# Altium footprint library OltestLib.PcbLib: 139 footprints (part 5 of 9)
Each footprint in its own frame and in the unit in brackets; x right, y up, seen from the top. Pads: shape width x height; smd on the part's side, far side on the other; paste and mask are expansions set on the pad; w line width, h text height; cw(c..) or ccw(c..) is an arc to the next point about the centre after c.
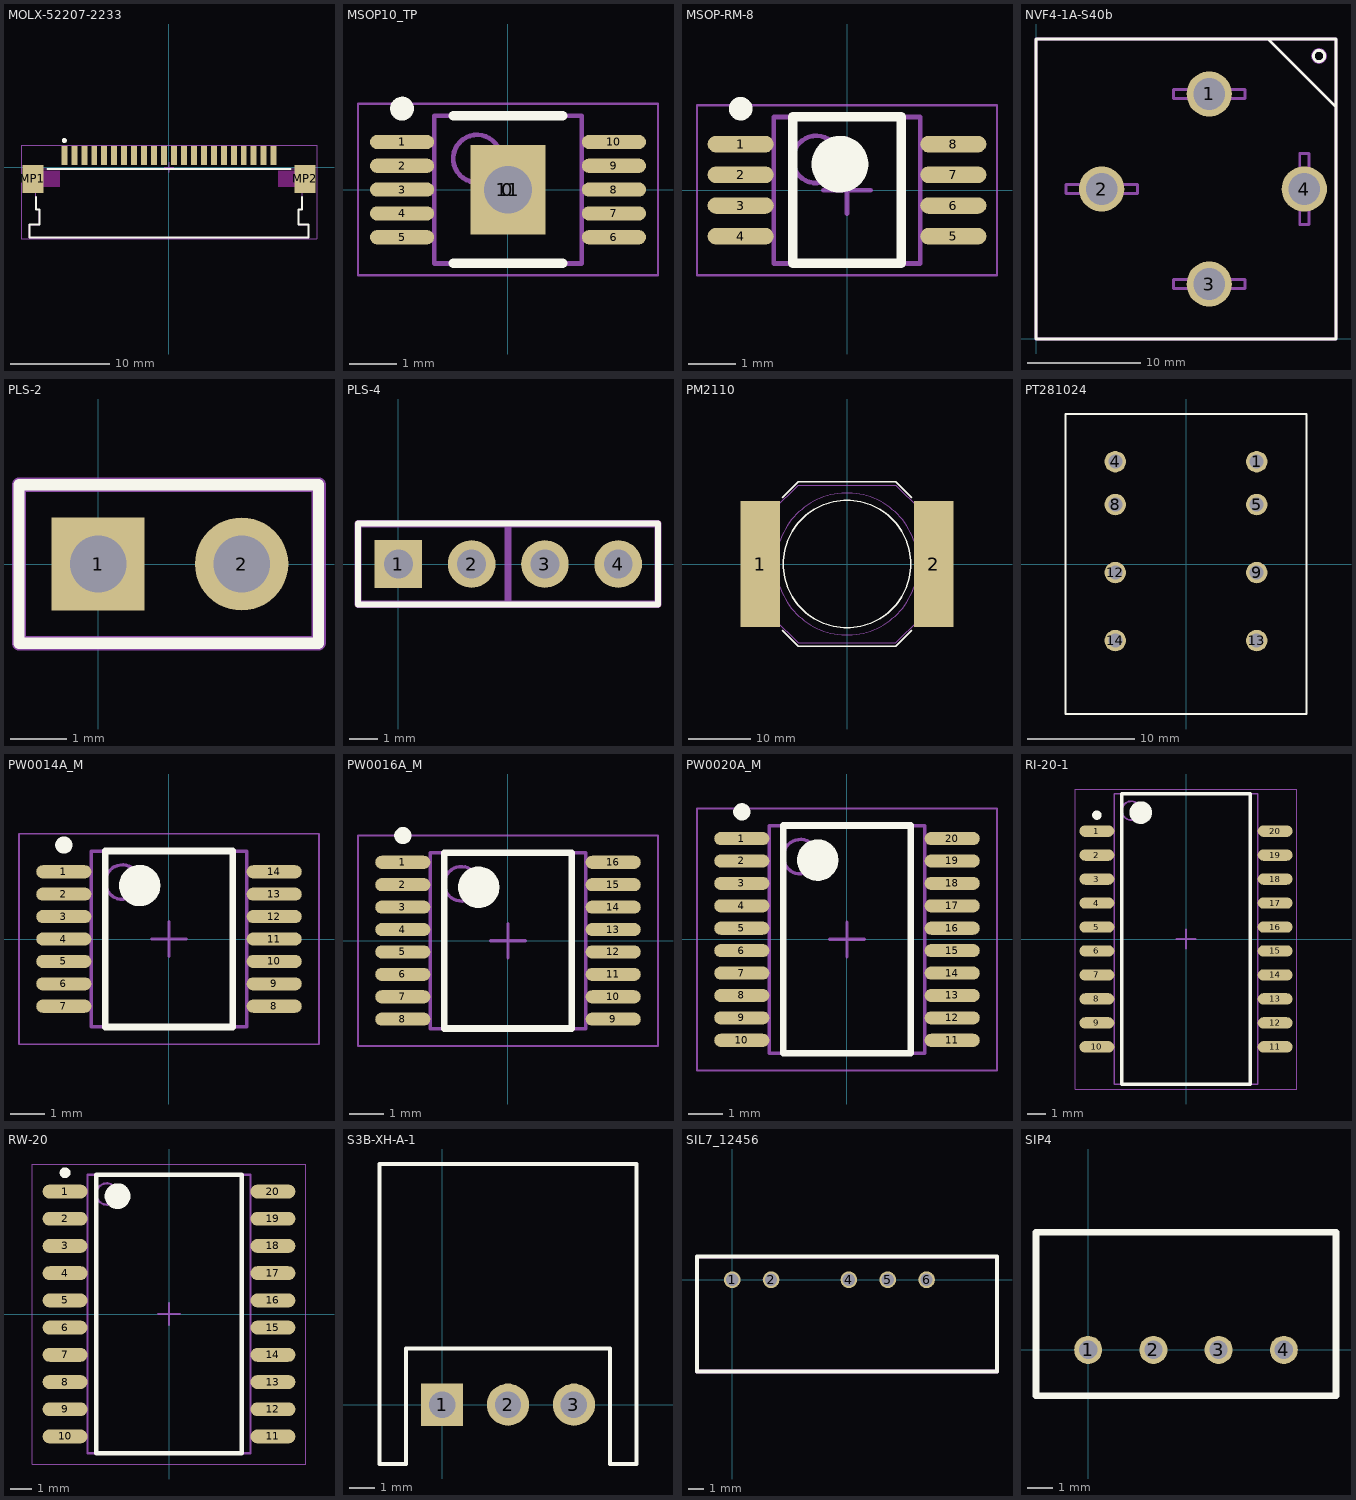
[diagram p4: the footprints below, top view; thin cyan lines are the x and y axes]

## MOLX-52207-2233 [mm] "FPC Connector, 22-Leads, Right Angle, Pitch 1.0 mm, Mated Height 2.7 mm, SMT"
height 2.712
pads (24):
  rect 0.6x1.9 smd: 1(-10.5,1.175) 2(-9.5,1.175) 3(-8.5,1.175) 4(-7.5,1.175) 5(-6.5,1.175) 6(-5.5,1.175) 7(-4.5,1.175) 8(-3.5,1.175) 9(-2.5,1.175) 10(-1.5,1.175) 11(-0.5,1.175) 12(0.5,1.175) 13(1.5,1.175) 14(2.5,1.175) 15(3.5,1.175) 16(4.5,1.175) 17(5.5,1.175) 18(6.5,1.175) 19(7.5,1.175) 20(8.5,1.175) 21(9.5,1.175) 22(10.5,1.175)
  rect 2.1x2.8 smd: MP1(-13.65,-1.175) MP2(13.65,-1.175)
Top Overlay:
  circle w0.25: c-10.5,2.675 r0.125
  lines w0.2: -13.35,-2.975 -13.35,-4.225 -13.013,-4.225 -13.012,-5.765 -14,-5.765 -14,-7.075 14,-7.075 14,-5.765 13.012,-5.765 13.012,-4.225 13.35,-4.225 13.35,-2.975 ; -12.2,-0.175 12.2,-0.175
Keep-Out Layer:
  region: 12.6,-0.375 10.95,-0.375 10.95,-1.975 12.6,-1.975
  region: -12.6,-0.375 -10.95,-0.375 -10.95,-1.975 -12.6,-1.975
Mechanical 13:
  lines w0.1: -14.15,-2.175 -14.15,-0.175 14.15,-0.175 14.15,-2.175 13.35,-2.175 13.35,-4.225 13.012,-4.225 13.012,-5.765 14,-5.765 14,-7.075 -14,-7.075 -14,-5.765 -13.012,-5.765 -13.012,-4.225 -13.35,-4.225 -13.35,-2.175 -14.15,-2.175
Mechanical 15:
  lines w0.05: -14.8,-7.175 -14.8,2.225 14.8,2.225 14.8,-7.175 -14.8,-7.175
  lines w0.1: -0.5,0 0.5,0 ; 0,-0.5 0,0.5
3D body "522072233.stp": height 2.71, standoff 0.01, extent -14.15,-7.075 14.15,1.825

## MSOP10_TP [mm] "S-PDSO-G10"
height 1.1
pads (12):
  round 1.3 hole 1: 0(0,0)
  oval 1.35x0.3 smd: 1(-2.225,1) 2(-2.225,0.5) 3(-2.225,0) 4(-2.225,-0.5) 5(-2.225,-1) 6(2.225,-1) 7(2.225,-0.5) 8(2.225,0) 9(2.225,0.5) 10(2.225,1)
  rect 1.57x1.88 smd: 11(0,0)
Top Overlay:
  circle w0.25: c-2.225,1.7 r0.125
  lines w0.2: -1.15,-1.55 1.15,-1.55 ; -1.15,1.55 1.15,1.55
Mechanical 13:
  circle w0.1: c-0.65,0.65 r0.5
  lines w0.1: -1.55,-1.55 1.55,-1.55 1.55,1.55 -1.55,1.55 -1.55,-1.55
Mechanical 15:
  lines w0.05: -3.15,-1.8 3.15,-1.8 3.15,1.8 -3.15,1.8 -3.15,-1.8
  lines w0.1: -0.5,0 0.5,0 ; 0,-0.5 0,0.5
3D body "MSOP10_TP.step": height 1.1, standoff 0, extent -2.45,-1.55 2.45,1.55

## MSOP-RM-8 [mm] "MSOP, 8-Leads, Body 3,00x3,00mm, Pitch 0,65mm, IPC Medium Density"
height 1.1
pads (8):
  oval 1.4x0.35 smd: 1(-2.25,0.975) 2(-2.25,0.325) 3(-2.25,-0.325) 4(-2.25,-0.975) 5(2.25,-0.975) 6(2.25,-0.325) 7(2.25,0.325) 8(2.25,0.975)
Top Overlay:
  circle w0.25: c-2.25,1.725 r0.125
  circle w0.6: c-0.15,0.55 r0.3
  lines w0.2: -1.15,-1.55 -1.15,1.55 1.15,1.55 1.15,-1.55 -1.15,-1.55
Mechanical 13:
  circle w0.1: c-0.65,0.65 r0.5
  lines w0.1: -1.55,-1.55 -1.55,1.55 1.55,1.55 1.55,-1.55 -1.55,-1.55
Mechanical 15:
  lines w0.05: -3.175,-1.8 -3.175,1.8 3.175,1.8 3.175,-1.8 -3.175,-1.8
  lines w0.1: -0.5,0 0.5,0 ; 0,-0.5 0,0.5
3D body "MSOP-RM-8.step": height 1.1, standoff 0, extent -2.45,-1.55 2.45,1.55

## NVF4-1A-S40b [mm]
height 27
pads (4):
  round 4 hole 2.8: 1(15.3,21.65) 2(5.8,13.25) 3(15.3,4.85) 4(23.7,13.25)
Top Overlay:
  circle w0.254: c25,25 r0.5
  lines w0.254: 20.5,26.5 26.5,20.5 ; 0,0 0,26.5 26.5,26.5 26.5,0 0,0
Mechanical 13:
  circle w0.254: c25,25 r0.566
  lines w0.254: 0,0 26.5,0 ; 0,0 0,26.5 ; 0,0 0,26.5 ; 0,0 26.5,0 ; 0,26.5 26.5,26.5 26.5,0 ; 0,26.5 20.5,26.5 26.5,20.5 26.5,0 ; 2.65,12.85 8.95,12.85 8.95,13.65 2.65,13.65 2.65,12.85 ; 12.15,4.45 12.15,5.25 18.45,5.25 18.45,4.45 12.15,4.45 ; 12.15,21.25 12.15,22.05 18.45,22.05 18.45,21.25 12.15,21.25 ; 23.3,10.1 24.1,10.1 24.1,16.4 23.3,16.4 23.3,10.1 ; 23.3,11.95 23.3,14.55 24.1,14.55 24.1,11.95 23.3,11.95
3D body: height 1.7, standoff 0, extent 14.001,21.251 16.6,22.05
3D body: height 1.7, standoff 0, extent 23.301,11.951 24.1,14.55
3D body: height 1.7, standoff 0, extent 14.001,4.451 16.6,5.25
3D body: height 1.7, standoff 0, extent 4.501,12.851 7.1,13.65
3D body: height 2.5, standoff 0, extent 12.151,21.251 18.449,22.049
3D body: height 2.5, standoff 0, extent 2.651,12.851 8.949,13.649
3D body: height 2.5, standoff 0, extent 12.151,4.451 18.449,5.249
3D body: height 2.5, standoff 0, extent 23.301,10.101 24.099,16.399
3D body: height 27, standoff 26.5, extent 24.435,24.435 25.565,25.565
3D body: height 26.5, standoff 2.5, extent 0.001,0.001 26.499,26.499
3D body: height 27, standoff 26.5, extent 0.001,0.001 26.499,26.499

## PLS-2 [mm] "Connector; IDC, Low Profile Male Header, Thru-Hole; 2 Position; Vertical; Pitch 2.54 mm"
height 8.5
pads (2):
  rect 1.65x1.65 hole 1: 1(0,0)
  round 1.65 hole 1: 2(2.54,0)
Top Overlay:
  lines w0.2: -1.4,-1.4 -1.4,1.4 3.9,1.4 3.9,-1.4 -1.4,-1.4
Mechanical 13:
  lines w0.254: 3.909,-1.391 3.909,1.4 3.9,-1.4 ; 3.9,-1.4 -1.4,-1.4 -1.4,1.4 3.9,1.4 3.9,-1.4
3D body "User Library-PLS-2.step": height 8.54, standoff -3, extent -1.28,-1.24 3.8,1.3

## PLS-4 [mm] "Connector; IDC, Low Profile Male Header, Thru-Hole; 10 Position; Vertical; Pitch 2.54 mm"
height 8.5
pads (4):
  rect 1.65x1.65 hole 1: 1(0,0)
  round 1.65 hole 1: 2(2.54,0) 3(5.08,0) 4(7.62,0)
Top Overlay:
  lines w0.2: -1.4,-1.4 -1.4,1.4 9,1.4 9,-1.4 -1.4,-1.4
Mechanical 13:
  lines w0.254: 3.8,-1.4 3.8,1.4 ; 3.8,-1.4 9,-1.4 9,1.4 3.8,1.4 ; 3.8,-1.4 -1.4,-1.4 -1.4,1.4 3.8,1.4 ; 3.8,-1.4 3.8,1.4
3D body "User Library-PLS-2.step": height 8.54, standoff -3, extent 3.86,-1.24 8.94,1.3
3D body "User Library-PLS-2.step": height 8.54, standoff -3, extent -1.28,-1.24 3.8,1.3

## PM2110 [mm] "PM2110"
height 14.478
pads (2):
  rect 6.35x20.32 smd: 1(-13.97,0) 2(13.97,0)
Top Overlay:
  circle w0.203: c0,0 r10.252
  lines w0.203: -10.414,-10.668 -7.874,-13.208 7.874,-13.208 10.414,-10.668 ; -10.414,10.668 -7.874,13.208 7.874,13.208 10.414,10.668
Mechanical 13:
  circle w0.152: c0,0 r11.416
  lines w0.152: -15.24,-8.89 -15.24,8.89 -11.684,8.89 -7.874,12.7 7.874,12.7 11.684,8.89 15.24,8.89 15.24,-8.89 11.684,-8.89 7.874,-12.7 -7.874,-12.7 -11.684,-8.89 -15.24,-8.89
3D body: height 14.48, standoff 2.54, extent -11.415,-11.415 11.415,11.415
3D body: height 2.54, standoff 0, extent -15.241,-12.701 15.241,12.701

## PT281024 [mm] "PT281024"
pads (8):
  round 2 hole 1.3: 1(6.6,9.55) 4(-6.6,9.55) 5(6.6,5.55) 8(-6.6,5.55) 9(6.6,-0.8) 12(-6.6,-0.8) 13(6.6,-7.15) 14(-6.6,-7.15)
Top Overlay:
  lines w0.152: -11.25,-14 -11.25,14 11.25,14 11.25,-14 -11.25,-14
3D body "c-5-1419111-3-99-3d.stp": height 30.11, standoff -4.09, extent -11.25,-14 11.25,14

## PW0014A_M [mm] "SOP, 14-Leads, Body 5.1x4.5mm, Pitch 0.65mm, IPC Low Density"
height 1.2
pads (14):
  oval 1.6x0.38 smd: 1(-3.05,1.95) 2(-3.05,1.3) 3(-3.05,0.65) 4(-3.05,0) 5(-3.05,-0.65) 6(-3.05,-1.3) 7(-3.05,-1.95) 8(3.05,-1.95) 9(3.05,-1.3) 10(3.05,-0.65) 11(3.05,0) 12(3.05,0.65) 13(3.05,1.3) 14(3.05,1.95)
Top Overlay:
  circle w0.25: c-3.05,2.725 r0.125
  circle w0.6: c-0.85,1.55 r0.3
  lines w0.2: -1.85,-2.55 -1.85,2.55 1.85,2.55 1.85,-2.55 -1.85,-2.55
Mechanical 13:
  circle w0.1: c-1.35,1.65 r0.5
  lines w0.1: -2.25,-2.55 -2.25,2.55 2.25,2.55 2.25,-2.55 -2.25,-2.55
Mechanical 15:
  lines w0.05: -4.35,-3.05 -4.35,3.05 4.35,3.05 4.35,-3.05 -4.35,-3.05
  lines w0.1: -0.5,0 0.5,0 ; 0,-0.5 0,0.5
3D body "PW0014AakaMTC14.stp": height 1.2, standoff 0, extent -3.21,-2.5 3.21,2.5

## PW0016A_M [mm] "TSSOP (R-PDSO-G16), 16-Leads, Body 5.1x4.5mm, Pitch 0.65mm"
height 1.2
pads (16):
  oval 1.6x0.38 smd: 1(-3.05,2.275) 2(-3.05,1.625) 3(-3.05,0.975) 4(-3.05,0.325) 5(-3.05,-0.325) 6(-3.05,-0.975) 7(-3.05,-1.625) 8(-3.05,-2.275) 9(3.05,-2.275) 10(3.05,-1.625) 11(3.05,-0.975) 12(3.05,-0.325) 13(3.05,0.325) 14(3.05,0.975) 15(3.05,1.625) 16(3.05,2.275)
Top Overlay:
  circle w0.25: c-3.05,3.05 r0.125
  circle w0.6: c-0.85,1.55 r0.3
  lines w0.2: -1.85,-2.55 -1.85,2.55 1.85,2.55 1.85,-2.55 -1.85,-2.55
Mechanical 13:
  circle w0.1: c-1.35,1.65 r0.5
  lines w0.1: -2.25,-2.55 -2.25,2.55 2.25,2.55 2.25,-2.55 -2.25,-2.55
Mechanical 15:
  lines w0.05: -4.35,-3.05 -4.35,3.05 4.35,3.05 4.35,-3.05 -4.35,-3.05
  lines w0.1: -0.5,0 0.5,0 ; 0,-0.5 0,0.5
3D body "PW0016AakaMTC16.stp": height 1.2, standoff 0, extent -3.21,-2.5 3.21,2.5

## PW0020A_M [mm] "SOP, 20-Leads, Body 6.6x4.5mm, Pitch 0.65mm, IPC Low Density"
height 1.2
pads (20):
  oval 1.6x0.38 smd: 1(-3.05,2.925) 2(-3.05,2.275) 3(-3.05,1.625) 4(-3.05,0.975) 5(-3.05,0.325) 6(-3.05,-0.325) 7(-3.05,-0.975) 8(-3.05,-1.625) 9(-3.05,-2.275) 10(-3.05,-2.925) 11(3.05,-2.925) 12(3.05,-2.275) 13(3.05,-1.625) 14(3.05,-0.975) 15(3.05,-0.325) 16(3.05,0.325) 17(3.05,0.975) 18(3.05,1.625) 19(3.05,2.275) 20(3.05,2.925)
Top Overlay:
  circle w0.6: c-0.85,2.3 r0.3
  circle w0.25: c-3.05,3.7 r0.125
  lines w0.2: -1.85,-3.3 1.85,-3.3 1.85,3.3 -1.85,3.3 -1.85,-3.3
Mechanical 13:
  circle w0.1: c-1.35,2.4 r0.5
  lines w0.1: -2.25,-3.3 2.25,-3.3 2.25,3.3 -2.25,3.3 -2.25,-3.3
Mechanical 15:
  lines w0.05: -4.35,-3.8 4.35,-3.8 4.35,3.8 -4.35,3.8 -4.35,-3.8
  lines w0.1: -0.5,0 0.5,0 ; 0,-0.5 0,0.5
3D body "PW0020AakaMTC20.stp": height 1.2, standoff 0, extent -3.21,-3.25 3.21,3.25

## RI-20-1 [mm] "SOIC, 20-Leads, Body 15,30x7,50mm, Pitch 1,27mm"
height 2.64
pads (20):
  oval 1.85x0.6 smd: 1(-4.725,5.715) 2(-4.725,4.445) 3(-4.725,3.175) 4(-4.725,1.905) 5(-4.725,0.635) 6(-4.725,-0.635) 7(-4.725,-1.905) 8(-4.725,-3.175) 9(-4.725,-4.445) 10(-4.725,-5.715) 11(4.725,-5.715) 12(4.725,-4.445) 13(4.725,-3.175) 14(4.725,-1.905) 15(4.725,-0.635) 16(4.725,0.635) 17(4.725,1.905) 18(4.725,3.175) 19(4.725,4.445) 20(4.725,5.715)
Top Overlay:
  circle w0.25: c-4.725,6.565 r0.125
  circle w0.6: c-2.4,6.7 r0.3
  lines w0.2: -3.4,-7.7 -3.4,7.7 3.4,7.7 3.4,-7.7 -3.4,-7.7
Mechanical 13:
  circle w0.1: c-2.9,6.8 r0.5
  lines w0.1: -3.8,-7.7 -3.8,7.7 3.8,7.7 3.8,-7.7 -3.8,-7.7
Mechanical 15:
  lines w0.05: -5.875,-7.95 -5.875,7.95 5.875,7.95 5.875,-7.95 -5.875,-7.95
  lines w0.1: -0.5,0 0.5,0 ; 0,-0.5 0,0.5
3D body "RI-20-1.step": height 2.64, standoff 0, extent -5.155,-7.7 5.155,7.7

## RW-20 [mm] "SOIC, 20-Leads, Body 12,80x7,50mm, Pitch 1,27mm, IPC Low Density"
height 2.65
pads (20):
  oval 2.1x0.65 smd: 1(-4.85,5.715) 2(-4.85,4.445) 3(-4.85,3.175) 4(-4.85,1.905) 5(-4.85,0.635) 6(-4.85,-0.635) 7(-4.85,-1.905) 8(-4.85,-3.175) 9(-4.85,-4.445) 10(-4.85,-5.715) 11(4.85,-5.715) 12(4.85,-4.445) 13(4.85,-3.175) 14(4.85,-1.905) 15(4.85,-0.635) 16(4.85,0.635) 17(4.85,1.905) 18(4.85,3.175) 19(4.85,4.445) 20(4.85,5.715)
Top Overlay:
  circle w0.25: c-4.85,6.59 r0.125
  circle w0.6: c-2.4,5.5 r0.3
  lines w0.2: -3.4,-6.5 -3.4,6.5 3.4,6.5 3.4,-6.5 -3.4,-6.5
Mechanical 13:
  circle w0.1: c-2.9,5.6 r0.5
  lines w0.1: -3.8,-6.5 -3.8,6.5 3.8,6.5 3.8,-6.5 -3.8,-6.5
Mechanical 15:
  lines w0.05: -6.375,-7 -6.375,7 6.375,7 6.375,-7 -6.375,-7
  lines w0.1: -0.5,0 0.5,0 ; 0,-0.5 0,0.5
3D body "SOIC127P1030X265-20M.step": height 2.65, standoff 0, extent -5.162,-6.5 5.162,6.5

## S3B-XH-A-1 [mil]
pads (3):
  rect 64x64 / inner round 0 / far side rect 64x64 hole 40 mask+5: 1(0,0)
  round 64 / inner round 0 / far side round 64 hole 40 mask+5: 2(100,0) 3(200,0)
Top Overlay:
  lines w6: -95,-90 -55,-90 -55,85 255,85 255,-90 295,-90 295,365 -95,365 -95,-90
3D body "S3B-XH-A.STEP": height 243.13, standoff -132.86, extent -94.88,-90.38 294.88,362.38

## SIL7_12456 [mil] "SIL-7 (big SIP-7)"
height 401.57
pads (5):
  round 43 / inner round 0 / far side round 43 hole 31.5 mask+4: 1(0,0) 2(100,0) 4(300,0) 5(400,0) 6(500,0)
Top Overlay:
  lines w10: -90.55,-236.22 681.1,-236.22 681.1,60 -90.55,60 -90.55,-236.22
Mechanical 13:
  lines w10: -90.55,-236.22 -90.55,59.06 681.1,59.06 681.1,-236.22 -90.55,-236.22
3D body: height 401.57, standoff 0, extent -90.53,-236.2 681.08,59.04

## SIP4 [mil]
pads (4):
  round 43 / inner round 0 / far side round 43 hole 28 mask+4: 1(0,0) 2(100,0) 3(200,0) 4(300,0)
Top Overlay:
  lines w10: -80,-70 -40,-70 380,-70 380,180 -80,180 -80,-70
3D body: height 400, standoff 0, extent -79.98,-69.98 379.98,179.98